# Altium footprint library ICs And Semiconductors THD.PcbLib: 292 footprints (part 3 of 19)
Each footprint in its own frame and in the unit in brackets; x right, y up, seen from the top. Pads: shape width x height; smd on the part's side, far side on the other; paste and mask are expansions set on the pad; w line width, h text height; cw(c..) or ccw(c..) is an arc to the next point about the centre after c.
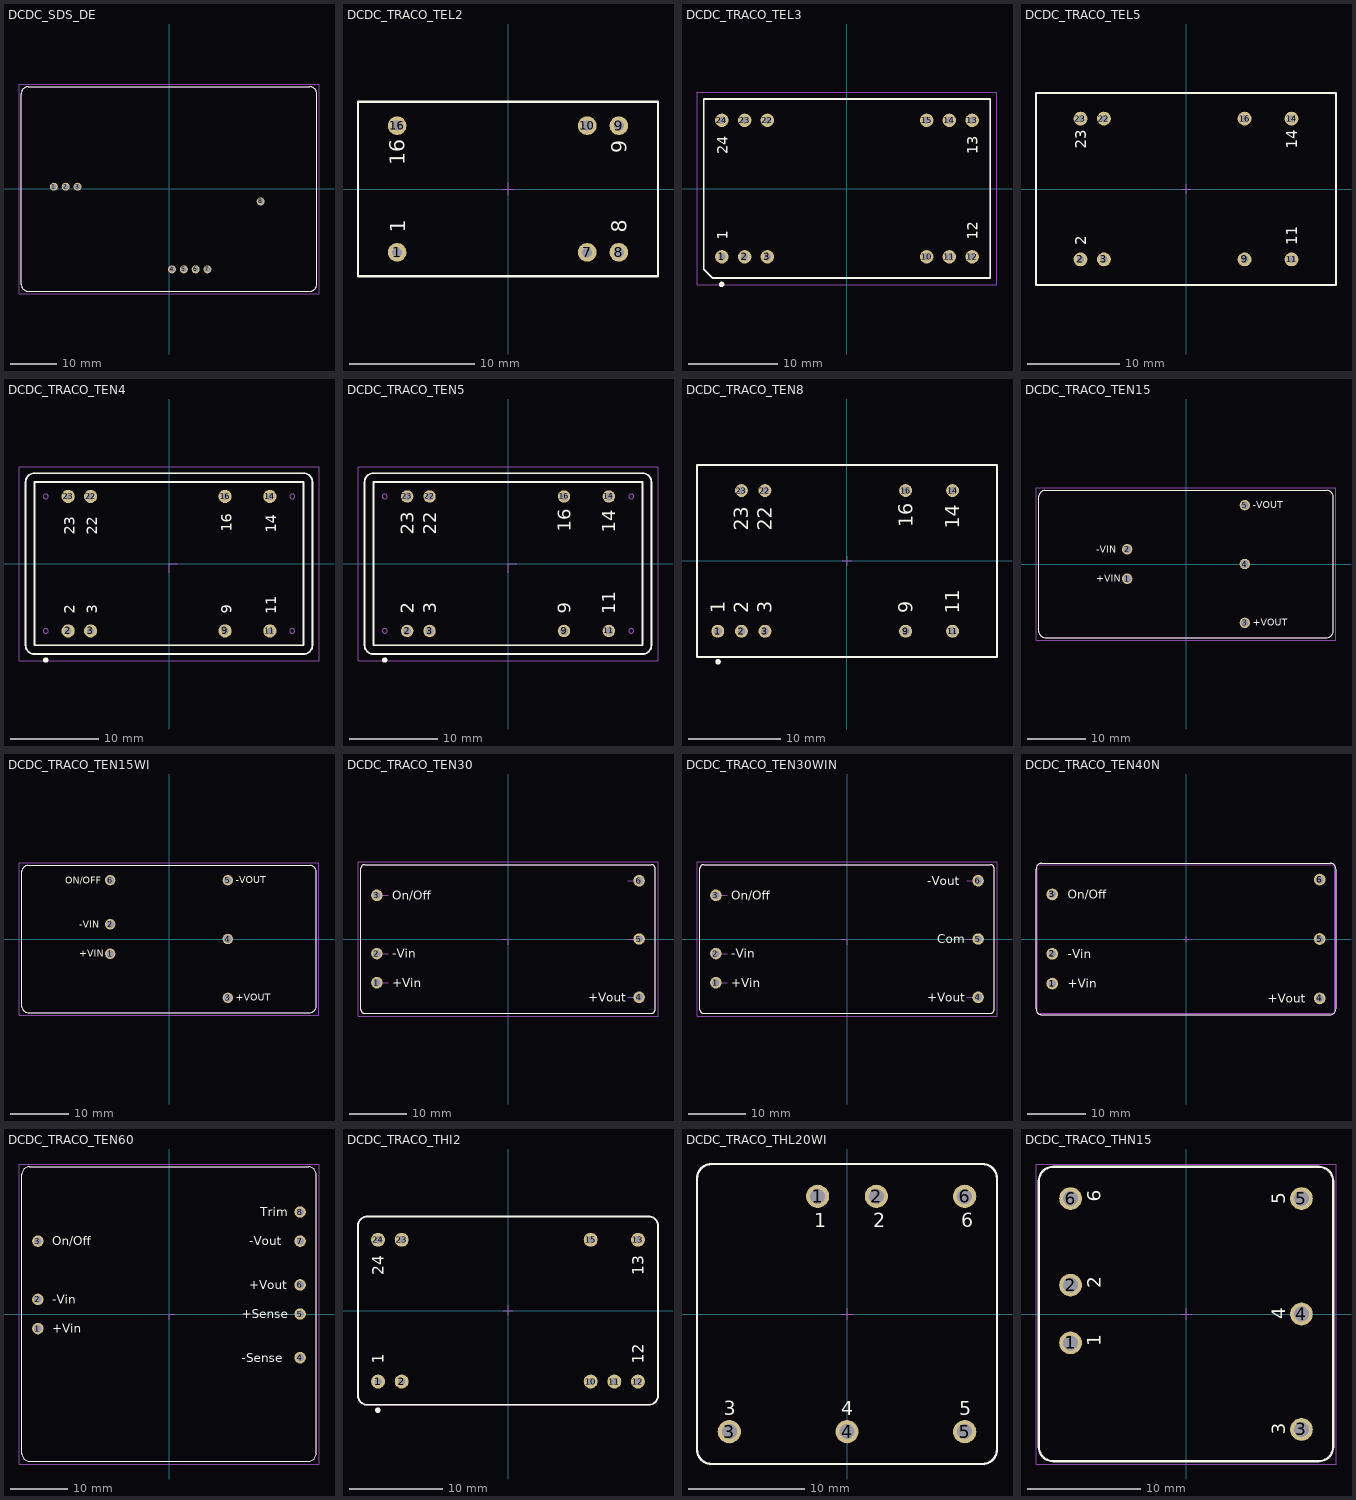
[diagram p2: the footprints below, top view; thin cyan lines are the x and y axes]

## DCDC_SDS_DE [mm] "DE Series , Body 63.5x44mm, high voltage DC-DC converter"
height 17.5
pads (8):
  round 1.7 hole 1.2: 1(-24.75,0.5) 2(-22.21,0.5) 3(-19.67,0.5) 4(0.65,-17.28) 5(3.19,-17.28) 6(5.73,-17.28) 7(8.27,-17.28) 8(19.7,-2.675)
Top Overlay:
  lines w0.2: -31.75,-20.5 ccw(c-30.25,-20.5) -30.25,-22 30.25,-22 ccw(c30.25,-20.5) 31.75,-20.5 31.75,20.5 ccw(c30.25,20.5) 30.25,22 -30.25,22 ccw(c-30.25,20.5) -31.75,20.5 -31.75,-20.5
Mechanical 14:
  lines w0.1: -31.75,-20.5 ccw(c-30.25,-20.5) -30.25,-22 30.25,-22 ccw(c30.25,-20.5) 31.75,-20.5 31.75,20.5 ccw(c30.25,20.5) 30.25,22 -30.25,22 ccw(c-30.25,20.5) -31.75,20.5 -31.75,-20.5
Mechanical 15:
  lines w0.05: -32.25,-22.5 32.25,-22.5 32.25,22.5 -32.25,22.5 -32.25,-22.5
3D body "DCDC_SDS_DE.stp": height 17.5, standoff -3.6, extent -31.75,-22 31.75,22

## DCDC_TRACO_TEL2 [mm] "TEL2 Series , Body 23.8x13.7mm, Pitch 2.54mm"
height 7.87
pads (6):
  round 1.5 hole 0.8: 1(-8.89,-5.08) 7(6.35,-5.08) 8(8.89,-5.08) 9(8.89,5.08) 10(6.35,5.08) 16(-8.89,5.08)
Top Overlay:
  lines w0.2: -12.025,-6.975 -12.025,6.975 12.025,6.975 12.025,-6.975 -12.025,-6.975
  text "8" at 9.525,-3.5 h1.2
  text "9" at 9.525,2.87 h1.2
  text "16" at -8.28,1.895 h1.2
  text "1" at -8.255,-3.5 h1.2
Notvisible:
  lines w0.1: -9.39,-5.08 -8.89,-5.08 ; -9.39,5.08 -8.89,5.08 ; -8.89,-5.58 -8.89,-5.08 ; -8.89,-4.58 -8.89,-5.08 ; -8.89,4.58 -8.89,5.08 ; -8.89,5.58 -8.89,5.08 ; -8.39,-5.08 -8.89,-5.08 ; -8.39,5.08 -8.89,5.08 ; -0.5,0 0,0 ; 0,-0.5 0,0 ; 0,0.5 0,0 ; 0.5,0 0,0 ; 5.85,-5.08 6.35,-5.08 ; 5.85,5.08 6.35,5.08 ; 6.35,-5.58 6.35,-5.08 ; 6.35,-4.58 6.35,-5.08 ; 6.35,4.58 6.35,5.08 ; 6.35,5.58 6.35,5.08 ; 6.85,-5.08 6.35,-5.08 ; 6.85,5.08 6.35,5.08 ; 8.39,-5.08 8.89,-5.08 ; 8.39,5.08 8.89,5.08 ; 8.89,-5.58 8.89,-5.08 ; 8.89,-4.58 8.89,-5.08 ; 8.89,4.58 8.89,5.08 ; 8.89,5.58 8.89,5.08 ; 9.39,-5.08 8.89,-5.08 ; 9.39,5.08 8.89,5.08
Mechanical 14:
  lines w0.1: -12.025,-6.975 -12.025,6.975 12.025,6.975 12.025,-6.975 -12.025,-6.975
  text "8" at 9.525,-3.5 h1.2
  text "9" at 9.525,2.87 h1.2
  text "16" at -8.28,1.895 h1.2
  text "1" at -8.255,-3.5 h1.2
3D body "DCDC_TRACO_TEL2.stp": height 7.87, standoff -3.2, extent -12.025,-6.975 12.025,6.975

## DCDC_TRACO_TEL3 [mm] "TEL3 Series , Body 32x20mm, Pitch 2.54mm"
height 10.7
pads (12):
  round 1.5 hole 0.8: 1(-13.97,-7.62) 2(-11.43,-7.62) 3(-8.89,-7.62) 10(8.89,-7.62) 11(11.43,-7.62) 12(13.97,-7.62) 13(13.97,7.62) 14(11.43,7.62) 15(8.89,7.62) 22(-8.89,7.62) 23(-11.43,7.62) 24(-13.97,7.62)
Top Overlay:
  circle w0.3: c-14,-10.7 r0.15
  lines w0.2: -16,-9 -16,10 16,10 16,-10 -15,-10 -16,-9
  text "1" at -13.335,-5.715 h1.2
  text "13" at 14.605,3.81 h1.2
  text "24" at -13.335,3.81 h1.2
  text "12" at 14.605,-5.715 h1.2
Mechanical 14:
  lines w0.1: -16,-9 -16,10 16,10 16,-10 -15,-10 -16,-9
  text "1" at -13.335,-5.715 h1.2
  text "12" at 14.605,-5.715 h1.2
  text "13" at 14.605,3.81 h1.2
  text "24" at -13.335,3.81 h1.2
Mechanical 15:
  lines w0.05: -16.75,-10.75 16.75,-10.75 16.75,10.75 -16.75,10.75 -16.75,-10.75
3D body "DCDC_TRACO_TEL3.stp": height 10.7, standoff -3.8, extent -16,-10 16,10

## DCDC_TRACO_TEL5 [mm] "TEL5 Series , Body 32x20.3mm"
height 10.7
pads (8):
  round 1.5 hole 0.8: 2(-11.43,-7.62) 3(-8.89,-7.62) 9(6.35,-7.62) 11(11.43,-7.62) 14(11.43,7.62) 16(6.35,7.62) 22(-8.89,7.62) 23(-11.43,7.62)
Top Overlay:
  lines w0.2: -16.25,-10.4 -16.25,10.4 16.25,10.4 16.25,-10.4 -16.25,-10.4
  text "2" at -10.82,-6.09 h1.2
  text "14" at 12.065,4.335 h1.2
  text "23" at -10.795,4.335 h1.2
  text "11" at 12.04,-6.09 h1.2
Notvisible:
  lines w0.1: -11.93,-7.62 -11.43,-7.62 ; -11.93,7.62 -11.43,7.62 ; -11.43,-8.12 -11.43,-7.62 ; -11.43,-7.12 -11.43,-7.62 ; -11.43,7.12 -11.43,7.62 ; -11.43,8.12 -11.43,7.62 ; -10.93,-7.62 -11.43,-7.62 ; -10.93,7.62 -11.43,7.62 ; -9.39,-7.62 -8.89,-7.62 ; -9.39,7.62 -8.89,7.62 ; -8.89,-8.12 -8.89,-7.62 ; -8.89,-7.12 -8.89,-7.62 ; -8.89,7.12 -8.89,7.62 ; -8.89,8.12 -8.89,7.62 ; -8.39,-7.62 -8.89,-7.62 ; -8.39,7.62 -8.89,7.62 ; -0.5,0 0,0 ; 0,-0.5 0,0 ; 0,0.5 0,0 ; 0.5,0 0,0 ; 5.85,-7.62 6.35,-7.62 ; 5.85,7.62 6.35,7.62 ; 6.35,-8.12 6.35,-7.62 ; 6.35,-7.12 6.35,-7.62 ; 6.35,7.12 6.35,7.62 ; 6.35,8.12 6.35,7.62 ; 6.85,-7.62 6.35,-7.62 ; 6.85,7.62 6.35,7.62 ; 10.93,-7.62 11.43,-7.62 ; 10.93,7.62 11.43,7.62 ; 11.43,-8.12 11.43,-7.62 ; 11.43,-7.12 11.43,-7.62 ; 11.43,7.12 11.43,7.62 ; 11.43,8.12 11.43,7.62 ; 11.93,-7.62 11.43,-7.62 ; 11.93,7.62 11.43,7.62
Mechanical 14:
  lines w0.1: -16.25,-10.4 -16.25,10.4 16.25,10.4 16.25,-10.4 -16.25,-10.4
  text "2" at -10.82,-6.09 h1.2
  text "11" at 12.04,-6.09 h1.2
  text "14" at 12.065,4.335 h1.2
  text "23" at -10.795,4.335 h1.2
3D body "DCDC_TRACO_TEL5.stp": height 10.7, standoff -3.6, extent -16.25,-10.4 16.25,10.4

## DCDC_TRACO_TEN4 [mm] "TEN 4 Series , Body 32.5x20.8mm, DIP-24 Package with Standard Pinout"
height 10.5
pads (8):
  round 1.5 hole 0.8: 2(-11.43,-7.62) 3(-8.89,-7.62) 9(6.35,-7.62) 11(11.43,-7.62) 14(11.43,7.62) 16(6.35,7.62) 22(-8.89,7.62) 23(-11.43,7.62)
Top Overlay:
  circle w0.3: c-13.97,-10.922 r0.15
  lines w0.2: -16.25,-9.25 ccw(c-15.25,-9.25) -15.25,-10.25 15.25,-10.25 ccw(c15.25,-9.25) 16.25,-9.25 16.25,9.25 ccw(c15.25,9.25) 15.25,10.25 -15.25,10.25 ccw(c-15.25,9.25) -16.25,9.25 -16.25,-9.25 ; -15.25,-9.25 15.25,-9.25 15.25,9.25 -15.25,9.25 -15.25,-9.25
  text "16" at 7.1,3.632 h1.2
  text "14" at 12.18,3.505 h1.2
  text "22" at -8.14,3.251 h1.2
  text "23" at -10.68,3.251 h1.2
  text "9" at 7.1,-5.663 h1.2
  text "11" at 12.18,-5.737 h1.2
  text "3" at -8.14,-5.663 h1.2
  text "2" at -10.68,-5.663 h1.2
Notvisible:
  circle w0.1: c13.97,7.62 r0.275
  circle w0.1: c13.97,-7.62 r0.275
  circle w0.1: c-13.97,7.62 r0.275
  circle w0.1: c-13.97,-7.62 r0.275
  lines w0.1: 0,-1 0,0 1,0
Mechanical 14:
  lines w0.1: -16.25,-9.25 ccw(c-15.25,-9.25) -15.25,-10.25 15.25,-10.25 ccw(c15.25,-9.25) 16.25,-9.25 16.25,9.25 ccw(c15.25,9.25) 15.25,10.25 -15.25,10.25 ccw(c-15.25,9.25) -16.25,9.25 -16.25,-9.25
  text "2" at -10.68,-5.663 h1.2
  text "3" at -8.14,-5.663 h1.2
  text "11" at 12.18,-5.737 h1.2
  text "9" at 7.1,-5.663 h1.2
  text "23" at -10.68,3.251 h1.2
  text "22" at -8.14,3.251 h1.2
  text "14" at 12.18,3.505 h1.2
  text "16" at 7.1,3.632 h1.2
Mechanical 15:
  lines w0.05: -17,-11 -17,11 17,11 17,-11 -17,-11
3D body "DCDC_TRACO_TEN4.stp": height 10.5, standoff -3.8, extent -16.25,-10.25 16.05,10.4

## DCDC_TRACO_TEN5 [mm] "TEN 5 Series , Body 32.5x20.5mm, DIP-24 Package with Standard Pinout"
height 10.5
pads (8):
  round 1.4 hole 0.9: 2(-11.43,-7.62) 3(-8.89,-7.62) 9(6.35,-7.62) 11(11.43,-7.62) 14(11.43,7.62) 16(6.35,7.62) 22(-8.89,7.62) 23(-11.43,7.62)
Top Overlay:
  circle w0.3: c-13.97,-10.922 r0.15
  lines w0.2: -16.25,-9.25 ccw(c-15.25,-9.25) -15.25,-10.25 15.25,-10.25 ccw(c15.25,-9.25) 16.25,-9.25 16.25,9.25 ccw(c15.25,9.25) 15.25,10.25 -15.25,10.25 ccw(c-15.25,9.25) -16.25,9.25 -16.25,-9.25 ; -15.25,-9.25 -15.25,9.25 15.25,9.25 15.25,-9.25 -15.25,-9.25
  text "2" at -10.68,-5.663 h1.5
  text "3" at -8.14,-5.663 h1.5
  text "11" at 12.18,-5.737 h1.5
  text "9" at 7.1,-5.663 h1.5
  text "23" at -10.68,3.251 h1.5
  text "22" at -8.14,3.251 h1.5
  text "14" at 12.18,3.505 h1.5
  text "16" at 7.1,3.632 h1.5
Notvisible:
  circle w0.1: c-13.97,-7.62 r0.275
  circle w0.1: c-13.97,7.62 r0.275
  circle w0.1: c13.97,-7.62 r0.275
  circle w0.1: c13.97,7.62 r0.275
  lines w0.1: 0,-1 0,0 1,0
Mechanical 14:
  lines w0.1: -16.25,-9.25 ccw(c-15.25,-9.25) -15.25,-10.25 15.25,-10.25 ccw(c15.25,-9.25) 16.25,-9.25 16.25,9.25 ccw(c15.25,9.25) 15.25,10.25 -15.25,10.25 ccw(c-15.25,9.25) -16.25,9.25 -16.25,-9.25
  text "16" at 7.1,3.632 h1.5
  text "14" at 12.18,3.505 h1.5
  text "22" at -8.14,3.251 h1.5
  text "23" at -10.68,3.251 h1.5
  text "9" at 7.1,-5.663 h1.5
  text "11" at 12.18,-5.737 h1.5
  text "3" at -8.14,-5.663 h1.5
  text "2" at -10.68,-5.663 h1.5
Mechanical 15:
  lines w0.05: -17,-11 17,-11 17,11 -17,11 -17,-11
3D body "DCDC_TRACO_TEN5.stp": height 10.5, standoff -3.8, extent -16.25,-10.25 16.25,10.25

## DCDC_TRACO_TEN8 [mm] "TEN 8 Series, Body 32x20mm"
height 10.7
pads (9):
  round 1.4 hole 0.9: 1(-14,-7.62) 2(-11.43,-7.62) 3(-8.89,-7.62) 9(6.35,-7.62) 11(11.43,-7.62) 14(11.43,7.62) 16(6.35,7.62) 22(-8.89,7.62) 23(-11.43,7.62)
Top Overlay:
  circle w0.3: c-13.97,-10.922 r0.15
  lines w0.2: -16.25,-10.4 16.25,-10.4 16.25,10.4 -16.25,10.4 -16.25,-10.4
  text "16" at 7.1,3.632 h1.5
  text "14" at 12.18,3.505 h1.5
  text "22" at -8.14,3.251 h1.5
  text "23" at -10.68,3.251 h1.5
  text "9" at 7.1,-5.663 h1.5
  text "11" at 12.18,-5.737 h1.5
  text "3" at -8.14,-5.663 h1.5
  text "2" at -10.68,-5.663 h1.5
  text "1" at -13.22,-5.663 h1.5
Notvisible:
  lines w0.1: -14.5,-7.62 -14,-7.62 ; -14,-8.12 -14,-7.62 ; -14,-7.12 -14,-7.62 ; -13.5,-7.62 -14,-7.62 ; -11.96,-7.62 -11.46,-7.62 ; -11.96,7.62 -11.46,7.62 ; -11.46,-8.12 -11.46,-7.62 ; -11.46,-7.12 -11.46,-7.62 ; -11.46,7.12 -11.46,7.62 ; -11.46,8.12 -11.46,7.62 ; -10.96,-7.62 -11.46,-7.62 ; -10.96,7.62 -11.46,7.62 ; -9.42,-7.62 -8.92,-7.62 ; -9.42,7.62 -8.92,7.62 ; -8.92,-8.12 -8.92,-7.62 ; -8.92,-7.12 -8.92,-7.62 ; -8.92,7.12 -8.92,7.62 ; -8.92,8.12 -8.92,7.62 ; -8.42,-7.62 -8.92,-7.62 ; -8.42,7.62 -8.92,7.62 ; -0.5,0 0,0 ; 0,-0.5 0,0 ; 0,0.5 0,0 ; 0.5,0 0,0 ; 5.82,-7.62 6.32,-7.62 ; 5.82,7.62 6.32,7.62 ; 6.32,-8.12 6.32,-7.62 ; 6.32,-7.12 6.32,-7.62 ; 6.32,7.12 6.32,7.62 ; 6.32,8.12 6.32,7.62 ; 6.82,-7.62 6.32,-7.62 ; 6.82,7.62 6.32,7.62 ; 10.9,-7.62 11.4,-7.62 ; 10.9,7.62 11.4,7.62 ; 11.4,-8.12 11.4,-7.62 ; 11.4,-7.12 11.4,-7.62 ; 11.4,7.12 11.4,7.62 ; 11.4,8.12 11.4,7.62 ; 11.9,-7.62 11.4,-7.62 ; 11.9,7.62 11.4,7.62
Mechanical 14:
  lines w0.1: -16.25,-10.4 16.25,-10.4 16.25,10.4 -16.25,10.4 -16.25,-10.4
  text "2" at -10.68,-5.663 h1.5
  text "3" at -8.14,-5.663 h1.5
  text "11" at 12.18,-5.737 h1.5
  text "9" at 7.1,-5.663 h1.5
  text "23" at -10.68,3.251 h1.5
  text "22" at -8.14,3.251 h1.5
  text "14" at 12.18,3.505 h1.5
  text "16" at 7.1,3.632 h1.5
  text "1" at -13.22,-5.663 h1.5
3D body "DCDC-TRACO_TEN8.stp": height 10.75, standoff -3.8, extent -16.25,-10.4 16.25,10.4

## DCDC_TRACO_TEN15 [mm] "TEN 15 Series , Body 50.8x25.4mm, Height 10.7mm"
height 10.7
pads (5):
  round 1.8 hole 1.3: 1(-10.16,-2.54) 2(-10.16,2.54) 3(10.16,-10.16) 4(10.16,0) 5(10.16,10.16)
Top Overlay:
  lines w0.2: -25.4,-11.7 ccw(c-24.4,-11.7) -24.4,-12.7 24.4,-12.7 ccw(c24.4,-11.7) 25.4,-11.7 25.4,11.7 ccw(c24.4,11.7) 24.4,12.7 -24.4,12.7 ccw(c-24.4,11.7) -25.4,11.7 -25.4,-11.7
  text "-VIN" at -15.5,1.9 h1.2
  text "-VOUT" at 11.56,9.645 h1.2
  text "+VOUT" at 11.56,-10.675 h1.2
  text "+VIN" at -15.5,-3.1 h1.2
Mechanical 14:
  lines w0.1: -25.4,-11.7 ccw(c-24.4,-11.7) -24.4,-12.7 24.4,-12.7 ccw(c24.4,-11.7) 25.4,-11.7 25.4,11.7 ccw(c24.4,11.7) 24.4,12.7 -24.4,12.7 ccw(c-24.4,11.7) -25.4,11.7 -25.4,-11.7
  text "+VOUT" at 11.56,-10.675 h1.2
  text "-VOUT" at 11.56,9.645 h1.2
  text "+VIN" at -15.5,-3.1 h1.2
  text "-VIN" at -15.5,1.9 h1.2
Mechanical 15:
  lines w0.05: -25.9,-13.2 25.9,-13.2 25.9,13.2 -25.9,13.2 -25.9,-13.2
3D body "DCDC_TRACO_TEN15.stp": height 10.2, standoff -3.8, extent -25.4,-12.7 25.4,12.7

## DCDC_TRACO_TEN15WI [mm] "TEN 15WI Series , Body 50.8x25.4mm, Height 10.2mm"
height 10.2
pads (6):
  round 1.8 hole 1.3: 1(-10.16,-2.54) 2(-10.16,2.54) 3(10.16,-10.16) 4(10.16,0) 5(10.16,10.16) 6(-10.16,10.16)
Top Overlay:
  lines w0.2: -25.4,-11.7 ccw(c-24.4,-11.7) -24.4,-12.7 24.4,-12.7 ccw(c24.4,-11.7) 25.4,-11.7 25.4,11.7 ccw(c24.4,11.7) 24.4,12.7 -24.4,12.7 ccw(c-24.4,11.7) -25.4,11.7 -25.4,-11.7
  text "ON/OFF" at -17.9,9.52 h1.2
  text "+VIN" at -15.5,-3.1 h1.2
  text "+VOUT" at 11.56,-10.675 h1.2
  text "-VOUT" at 11.56,9.645 h1.2
  text "-VIN" at -15.5,1.9 h1.2
Mechanical 14:
  lines w0.1: -25.4,-11.7 ccw(c-24.4,-11.7) -24.4,-12.7 24.4,-12.7 ccw(c24.4,-11.7) 25.4,-11.7 25.4,11.7 ccw(c24.4,11.7) 24.4,12.7 -24.4,12.7 ccw(c-24.4,11.7) -25.4,11.7 -25.4,-11.7
  text "ON/OFF" at -17.9,9.52 h1.2
  text "-VIN" at -15.5,1.9 h1.2
  text "+VIN" at -15.5,-3.1 h1.2
  text "-VOUT" at 11.56,9.645 h1.2
  text "+VOUT" at 11.56,-10.675 h1.2
Mechanical 15:
  lines w0.05: -25.9,-13.2 -25.9,13.2 25.9,13.2 25.9,-13.2 -25.9,-13.2
3D body "DCDC_TRACO_TEN15WI.stp": height 10.2, standoff -3.8, extent -25.4,-12.7 25.4,12.7

## DCDC_TRACO_TEN30 [mm] "TEN 30 Series , Body 51.3x25.9mm"
height 10.7
pads (6):
  round 2 hole 1.3: 1(-22.86,-7.62) 2(-22.86,-2.54) 3(-22.86,7.62) 4(22.86,-10.16) 5(22.86,0) 6(22.86,10.16)
Top Overlay:
  lines w0.2: -25.65,-12.315 ccw(c-25.015,-12.315) -25.015,-12.95 25.015,-12.95 ccw(c25.015,-12.315) 25.65,-12.315 25.65,12.315 ccw(c25.015,12.315) 25.015,12.95 -25.015,12.95 ccw(c-25.015,12.315) -25.65,12.315 -25.65,-12.315
  text "+Vin" at -20.193,-8.37 h1.5
  text "-Vin" at -20.193,-3.29 h1.5
  text "On/Off" at -20.193,6.87 h1.5
  text "+Vout" at 13.999,-10.91 h1.5
Notvisible:
  lines w0.1: -22.86,-7.62 -20.86,-7.62 ; -22.86,-2.54 -20.86,-2.54 ; -22.86,7.62 -20.86,7.62 ; -1,0 0,0 0,-1 ; 20.86,-10.16 22.86,-10.16 ; 20.86,0 22.86,0 ; 20.86,10.16 22.86,10.16
Mechanical 14:
  lines w0.1: -25.65,-12.315 ccw(c-25.015,-12.315) -25.015,-12.95 25.015,-12.95 ccw(c25.015,-12.315) 25.65,-12.315 25.65,12.315 ccw(c25.015,12.315) 25.015,12.95 -25.015,12.95 ccw(c-25.015,12.315) -25.65,12.315 -25.65,-12.315
Mechanical 15:
  lines w0.05: -26.15,-13.45 -26.15,13.45 26.15,13.45 26.15,-13.45 -26.15,-13.45
3D body "DCDC_TRACO_TEN30.stp": height 10.7, standoff -3.8, extent -25.4,-12.7 25.4,12.7

## DCDC_TRACO_TEN30WIN [mm] "TEN 30WIN Series , Body 51.3x25.9mm"
height 10.7
pads (6):
  round 2 hole 1.3: 1(-22.86,-7.62) 2(-22.86,-2.54) 3(-22.86,7.62) 4(22.86,-10.16) 5(22.86,0) 6(22.86,10.16)
Top Overlay:
  lines w0.2: -25.65,-12.315 ccw(c-25.015,-12.315) -25.015,-12.95 25.015,-12.95 ccw(c25.015,-12.315) 25.65,-12.315 25.65,12.315 ccw(c25.015,12.315) 25.015,12.95 -25.015,12.95 ccw(c-25.015,12.315) -25.65,12.315 -25.65,-12.315
  text "+Vin" at -20.193,-8.37 h1.5
  text "-Vin" at -20.193,-3.29 h1.5
  text "On/Off" at -20.193,6.87 h1.5
  text "-Vout" at 13.999,9.41 h1.5
  text "Com" at 15.769,-0.75 h1.5
  text "+Vout" at 13.999,-10.91 h1.5
Notvisible:
  circle w0.1: c-22.86,7.62 r0.5
  circle w0.1: c-22.86,-2.54 r0.5
  circle w0.1: c-22.86,-7.62 r0.5
  circle w0.1: c22.86,-10.16 r0.5
  circle w0.1: c22.86,0 r0.5
  circle w0.1: c22.86,10.16 r0.5
  lines w0.1: -22.86,-7.62 -20.86,-7.62 ; -22.86,-2.54 -20.86,-2.54 ; -22.86,7.62 -20.86,7.62 ; -1,0 0,0 0,-1 ; 20.86,-10.16 22.86,-10.16 ; 20.86,0 22.86,0 ; 20.86,10.16 22.86,10.16
Mechanical 14:
  lines w0.1: -25.65,-12.315 ccw(c-25.015,-12.315) -25.015,-12.95 25.015,-12.95 ccw(c25.015,-12.315) 25.65,-12.315 25.65,12.315 ccw(c25.015,12.315) 25.015,12.95 -25.015,12.95 ccw(c-25.015,12.315) -25.65,12.315 -25.65,-12.315
Mechanical 15:
  lines w0.05: -26.15,-13.45 -26.15,13.45 26.15,13.45 26.15,-13.45 -26.15,-13.45
3D body "DCDC_TRACO_TEN30WIN.stp": height 10.7, standoff -3.8, extent -25.4,-12.7 25.4,12.7

## DCDC_TRACO_TEN40N [mm] "TEN 40N Series , Body 50.8x  25.4mm"
height 10.45
pads (6):
  round 2 hole 1.3: 1(-22.86,-7.62) 2(-22.86,-2.54) 3(-22.86,7.62) 4(22.86,-10.16) 5(22.86,0) 6(22.86,10.16)
Top Overlay:
  lines w0.2: -25.65,-11.95 ccw(c-24.65,-11.95) -24.65,-12.95 24.65,-12.95 ccw(c24.65,-11.95) 25.65,-11.95 25.65,11.95 ccw(c24.65,11.95) 24.65,12.95 -24.65,12.95 ccw(c-24.65,11.95) -25.65,11.95 -25.65,-11.95
  text "+Vout" at 13.999,-10.91 h1.5
  text "On/Off" at -20.193,6.87 h1.5
  text "-Vin" at -20.193,-3.29 h1.5
  text "+Vin" at -20.193,-8.37 h1.5
Notvisible:
  lines w0.1: -23.36,-7.62 -22.86,-7.62 ; -23.36,-2.54 -22.86,-2.54 ; -23.36,7.62 -22.86,7.62 ; -22.86,-8.12 -22.86,-7.62 ; -22.86,-7.12 -22.86,-7.62 ; -22.86,-3.04 -22.86,-2.54 ; -22.86,-2.04 -22.86,-2.54 ; -22.86,7.12 -22.86,7.62 ; -22.86,8.12 -22.86,7.62 ; -22.36,-7.62 -22.86,-7.62 ; -22.36,-2.54 -22.86,-2.54 ; -22.36,7.62 -22.86,7.62 ; -0.5,0 0,0 ; 0,-0.5 0,0 ; 0,0.5 0,0 ; 0.5,0 0,0 ; 22.36,-10.16 22.86,-10.16 ; 22.36,0 22.86,0 ; 22.36,10.16 22.86,10.16 ; 22.86,-10.66 22.86,-10.16 ; 22.86,-9.66 22.86,-10.16 ; 22.86,-0.5 22.86,0 ; 22.86,0.5 22.86,0 ; 22.86,9.66 22.86,10.16 ; 22.86,10.66 22.86,10.16 ; 23.36,-10.16 22.86,-10.16 ; 23.36,0 22.86,0 ; 23.36,10.16 22.86,10.16 ; -25.4,-12.7 25.4,-12.7 25.4,12.7 -25.4,12.7 -25.4,-12.7
Mechanical 14:
  lines w0.1: -25.65,-11.95 ccw(c-24.65,-11.95) -24.65,-12.95 24.65,-12.95 ccw(c24.65,-11.95) 25.65,-11.95 25.65,11.95 ccw(c24.65,11.95) 24.65,12.95 -24.65,12.95 ccw(c-24.65,11.95) -25.65,11.95 -25.65,-11.95
3D body "DCDC_TRACO_TEN40N.stp": height 10.45, standoff -3.8, extent -25.65,-12.95 25.65,12.95

## DCDC_TRACO_TEN60 [mm] "TEN 60 Series , Body 51.3x51.3mm"
height 10.7
pads (8):
  round 2 hole 1.3: 1(-22.86,-2.54) 2(-22.86,2.54) 3(-22.86,12.7) 4(22.86,-7.62) 5(22.86,0) 6(22.86,5.08) 7(22.86,12.7) 8(22.86,17.78)
Top Overlay:
  lines w0.2: -25.65,-24.4 ccw(c-24.4,-24.4) -24.4,-25.65 24.4,-25.65 ccw(c24.4,-24.4) 25.65,-24.4 25.65,24.4 ccw(c24.4,24.4) 24.4,25.65 -24.4,25.65 ccw(c-24.4,24.4) -25.65,24.4 -25.65,-24.4
  text "+Vout" at 13.97,4.33 h1.5
  text "On/Off" at -20.32,11.95 h1.5
  text "-Vin" at -20.32,1.79 h1.5
  text "+Vin" at -20.32,-3.29 h1.5
  text "+Sense" at 12.7,-0.75 h1.5
  text "-Sense" at 12.7,-8.37 h1.5
  text "-Vout" at 13.97,11.95 h1.5
  text "Trim" at 15.875,17.03 h1.5
Notvisible:
  lines w0.1: 0,-1 0,0 1,0
Mechanical 14:
  lines w0.1: -25.65,-24.4 ccw(c-24.4,-24.4) -24.4,-25.65 24.4,-25.65 ccw(c24.4,-24.4) 25.65,-24.4 25.65,24.4 ccw(c24.4,24.4) 24.4,25.65 -24.4,25.65 ccw(c-24.4,24.4) -25.65,24.4 -25.65,-24.4
Mechanical 15:
  lines w0.05: -26.15,-26.15 -26.15,26.15 26.15,26.15 26.15,-26.15 -26.15,-26.15
3D body "DCDC_TRACO_TEN60.stp": height 10.7, standoff -3.8, extent -25.65,-25.65 25.65,25.65

## DCDC_TRACO_THI2 [mm] "THI Series , Body 32x20mm, Pitch 2.54mm"
height 10.25
pads (9):
  round 1.5 hole 0.8: 1(-13.97,-7.62) 2(-11.43,-7.62) 10(8.89,-7.62) 11(11.43,-7.62) 12(13.97,-7.62) 13(13.97,7.62) 15(8.89,7.62) 23(-11.43,7.62) 24(-13.97,7.62)
Top Overlay:
  circle w0.3: c-14,-10.7 r0.15
  lines w0.2: -16.125,-9.125 ccw(c-15.125,-9.125) -15.125,-10.125 15.125,-10.125 ccw(c15.125,-9.125) 16.125,-9.125 16.125,9.125 ccw(c15.125,9.125) 15.125,10.125 -15.125,10.125 ccw(c-15.125,9.125) -16.125,9.125 -16.125,-9.125
  text "12" at 14.605,-5.715 h1.2
  text "24" at -13.335,3.81 h1.2
  text "13" at 14.605,3.81 h1.2
  text "1" at -13.335,-5.715 h1.2
Notvisible:
  lines w0.1: -14.47,-7.62 -13.97,-7.62 ; -14.47,7.62 -13.97,7.62 ; -13.97,-8.12 -13.97,-7.62 ; -13.97,-7.12 -13.97,-7.62 ; -13.97,7.12 -13.97,7.62 ; -13.97,8.12 -13.97,7.62 ; -13.47,-7.62 -13.97,-7.62 ; -13.47,7.62 -13.97,7.62 ; -11.93,-7.62 -11.43,-7.62 ; -11.93,7.62 -11.43,7.62 ; -11.43,-8.12 -11.43,-7.62 ; -11.43,-7.12 -11.43,-7.62 ; -11.43,7.12 -11.43,7.62 ; -11.43,8.12 -11.43,7.62 ; -10.93,-7.62 -11.43,-7.62 ; -10.93,7.62 -11.43,7.62 ; -0.5,0 0,0 ; 0,-0.5 0,0 ; 0,0.5 0,0 ; 0.5,0 0,0 ; 8.39,-7.62 8.89,-7.62 ; 8.39,7.62 8.89,7.62 ; 8.89,-8.12 8.89,-7.62 ; 8.89,-7.12 8.89,-7.62 ; 8.89,7.12 8.89,7.62 ; 8.89,8.12 8.89,7.62 ; 9.39,-7.62 8.89,-7.62 ; 9.39,7.62 8.89,7.62 ; 10.93,-7.62 11.43,-7.62 ; 11.43,-8.12 11.43,-7.62 ; 11.43,-7.12 11.43,-7.62 ; 11.93,-7.62 11.43,-7.62 ; 13.47,-7.62 13.97,-7.62 ; 13.47,7.62 13.97,7.62 ; 13.97,-8.12 13.97,-7.62 ; 13.97,-7.12 13.97,-7.62 ; 13.97,7.12 13.97,7.62 ; 13.97,8.12 13.97,7.62 ; 14.47,-7.62 13.97,-7.62 ; 14.47,7.62 13.97,7.62
Mechanical 14:
  lines w0.1: -16.125,-9.125 ccw(c-15.125,-9.125) -15.125,-10.125 15.125,-10.125 ccw(c15.125,-9.125) 16.125,-9.125 16.125,9.125 ccw(c15.125,9.125) 15.125,10.125 -15.125,10.125 ccw(c-15.125,9.125) -16.125,9.125 -16.125,-9.125
  text "24" at -13.335,3.81 h1.2
  text "13" at 14.605,3.81 h1.2
  text "12" at 14.605,-5.715 h1.2
  text "1" at -13.335,-5.715 h1.2
3D body "DCDC_TRACO_THI2.stp": height 10.25, standoff -3.8, extent -16.125,-10.125 16.125,10.125

## DCDC_TRACO_THL20WI [mm] "THL 20WI Series , Body 25.4x25.4mm, Height 10.7mm"
height 10.7
pads (6):
  round 2 hole 1.3: 1(-2.54,10.16) 2(2.54,10.16) 3(-10.16,-10.16) 4(0,-10.16) 5(10.16,-10.16) 6(10.16,10.16)
Top Overlay:
  lines w0.2: -12.95,-11.7 ccw(c-11.7,-11.7) -11.7,-12.95 11.7,-12.95 ccw(c11.7,-11.7) 12.95,-11.7 12.95,11.7 ccw(c11.7,11.7) 11.7,12.95 -11.7,12.95 ccw(c-11.7,11.7) -12.95,11.7 -12.95,-11.7
  text "3" at -10.643,-8.756 h1.2
  text "4" at -0.483,-8.756 h1.2
  text "5" at 9.677,-8.756 h1.2
  text "6" at 9.881,7.486 h1.2
  text "2" at 2.261,7.486 h1.2
  text "1" at -2.819,7.486 h1.2
Notvisible:
  lines w0.1: -10.66,-10.16 -10.16,-10.16 ; -10.16,-10.66 -10.16,-10.16 ; -10.16,-9.66 -10.16,-10.16 ; -9.66,-10.16 -10.16,-10.16 ; -3.04,10.16 -2.54,10.16 ; -2.54,9.66 -2.54,10.16 ; -2.54,10.66 -2.54,10.16 ; -2.04,10.16 -2.54,10.16 ; -0.5,-10.16 0,-10.16 ; -0.5,0 0,0 ; 0,-10.66 0,-10.16 ; 0,-9.66 0,-10.16 ; 0,-0.5 0,0 ; 0,0.5 0,0 ; 0.5,-10.16 0,-10.16 ; 0.5,0 0,0 ; 2.04,10.16 2.54,10.16 ; 2.54,9.66 2.54,10.16 ; 2.54,10.66 2.54,10.16 ; 3.04,10.16 2.54,10.16 ; 9.66,-10.16 10.16,-10.16 ; 9.66,10.16 10.16,10.16 ; 10.16,-10.66 10.16,-10.16 ; 10.16,-9.66 10.16,-10.16 ; 10.16,9.66 10.16,10.16 ; 10.16,10.66 10.16,10.16 ; 10.66,-10.16 10.16,-10.16 ; 10.66,10.16 10.16,10.16
Mechanical 14:
  lines w0.1: -12.95,-11.7 ccw(c-11.7,-11.7) -11.7,-12.95 11.7,-12.95 ccw(c11.7,-11.7) 12.95,-11.7 12.95,11.7 ccw(c11.7,11.7) 11.7,12.95 -11.7,12.95 ccw(c-11.7,11.7) -12.95,11.7 -12.95,-11.7
  text "3" at -10.643,-8.756 h1.2
  text "4" at -0.483,-8.756 h1.2
  text "5" at 9.677,-8.756 h1.2
  text "6" at 9.881,7.486 h1.2
  text "2" at 2.261,7.486 h1.2
  text "1" at -2.819,7.486 h1.2
3D body "DCDC_TRACO_THL20WI.stp": height 10.7, standoff -3.6, extent -12.95,-12.95 12.95,12.95

## DCDC_TRACO_THN15 [mm] "THN 15 Series , Body 25.4x25.4mm, Height 9.9mm"
height 9.9
pads (6):
  round 2 hole 1.3: 1(-10.16,-2.54) 2(-10.16,2.54) 3(10.16,-10.16) 4(10.16,0) 5(10.16,10.16) 6(-10.16,10.16)
Top Overlay:
  lines w0.2: -12.95,-11.7 ccw(c-11.7,-11.7) -11.7,-12.95 11.7,-12.95 ccw(c11.7,-11.7) 12.95,-11.7 12.95,11.7 ccw(c11.7,11.7) 11.7,12.95 -11.7,12.95 ccw(c-11.7,11.7) -12.95,11.7 -12.95,-11.7
  text "3" at 8.756,-10.643 h1.2
  text "4" at 8.756,-0.483 h1.2
  text "5" at 8.756,9.677 h1.2
  text "6" at -7.486,9.881 h1.2
  text "2" at -7.486,2.261 h1.2
  text "1" at -7.486,-2.819 h1.2
Notvisible:
  lines w0.1: -10.66,-2.54 -10.16,-2.54 ; -10.66,2.54 -10.16,2.54 ; -10.66,10.16 -10.16,10.16 ; -10.16,-3.04 -10.16,-2.54 ; -10.16,-2.04 -10.16,-2.54 ; -10.16,2.04 -10.16,2.54 ; -10.16,3.04 -10.16,2.54 ; -10.16,9.66 -10.16,10.16 ; -10.16,10.66 -10.16,10.16 ; -9.66,-2.54 -10.16,-2.54 ; -9.66,2.54 -10.16,2.54 ; -9.66,10.16 -10.16,10.16 ; -0.5,0 0,0 ; 0,-0.5 0,0 ; 0,0.5 0,0 ; 0.5,0 0,0 ; 9.66,-10.16 10.16,-10.16 ; 9.66,0 10.16,0 ; 9.66,10.16 10.16,10.16 ; 10.16,-10.66 10.16,-10.16 ; 10.16,-9.66 10.16,-10.16 ; 10.16,-0.5 10.16,0 ; 10.16,0.5 10.16,0 ; 10.16,9.66 10.16,10.16 ; 10.16,10.66 10.16,10.16 ; 10.66,-10.16 10.16,-10.16 ; 10.66,0 10.16,0 ; 10.66,10.16 10.16,10.16
Mechanical 14:
  lines w0.1: -12.95,-11.7 ccw(c-11.7,-11.7) -11.7,-12.95 11.7,-12.95 ccw(c11.7,-11.7) 12.95,-11.7 12.95,11.7 ccw(c11.7,11.7) 11.7,12.95 -11.7,12.95 ccw(c-11.7,11.7) -12.95,11.7 -12.95,-11.7
  text "3" at 8.756,-10.643 h1.2
  text "4" at 8.756,-0.483 h1.2
  text "5" at 8.756,9.677 h1.2
  text "6" at -7.486,9.881 h1.2
  text "2" at -7.486,2.261 h1.2
  text "1" at -7.486,-2.819 h1.2
Mechanical 15:
  lines w0.1: -13.2,-13.2 13.2,-13.2 13.2,13.2 -13.2,13.2 -13.2,-13.2
3D body "DCDC_TRACO_THN15.stp": height 9.9, standoff -3.6, extent -12.95,-12.95 12.95,12.95